# Altium footprint library Libraries_2014_0618.PcbLib: 391 footprints (part 11 of 25)
Each footprint in its own frame and in the unit in brackets; x right, y up, seen from the top. Pads: shape width x height; smd on the part's side, far side on the other; paste and mask are expansions set on the pad; w line width, h text height; cw(c..) or ccw(c..) is an arc to the next point about the centre after c.
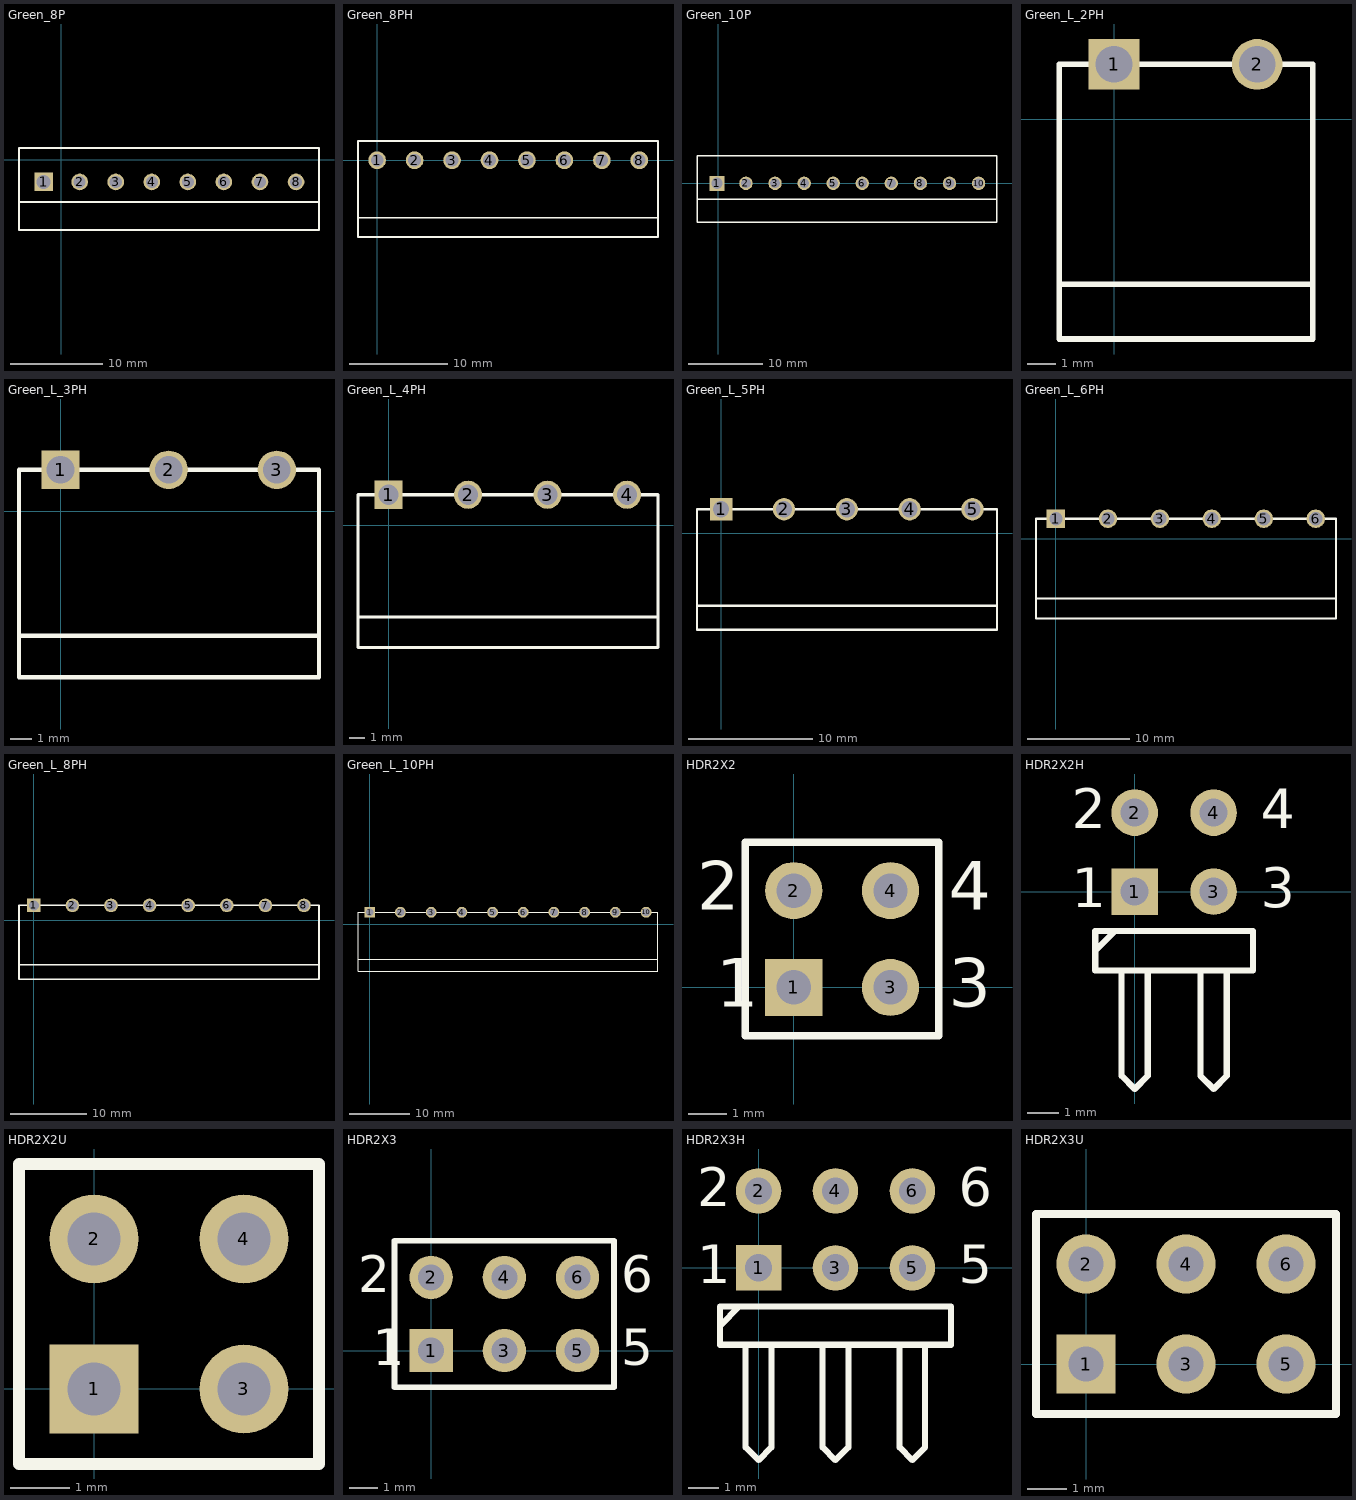
[diagram p10: the footprints below, top view; thin cyan lines are the x and y axes]

## Green_8P [mm]
pads (8):
  rect 2x2 hole 1.5: 1(-1.905,-2.413)
  round 1.8 hole 1.3: 2(1.995,-2.413) 3(5.895,-2.413) 4(9.795,-2.413) 5(13.695,-2.413) 6(17.595,-2.413) 7(21.495,-2.413) 8(25.395,-2.413)
Top Overlay:
  lines w0.2: -4.572,-4.572 8.382,-4.572 ; -0.762,-7.62 12.192,-7.62 ; -0.762,-4.572 12.192,-4.572 ; 8.382,-7.62 -4.572,-7.62 -4.572,1.27 12.192,1.27 ; 11.028,-7.62 23.982,-7.62 ; 11.028,-4.572 23.982,-4.572 ; 11.028,1.27 27.792,1.27 ; 23.957,-7.62 27.864,-7.62 ; 23.957,-4.572 27.864,-4.572 ; 27.882,-7.62 27.882,1.27

## Green_8PH [mm]
pads (8):
  round 1.8 hole 1.3: 1(0,0) 2(3.81,0) 3(7.62,0) 4(11.43,0) 5(15.24,0) 6(19.05,0) 7(22.86,0) 8(26.67,0)
Top Overlay:
  lines w0.2: 28.575,-5.85 -1.95,-5.85 ; -1.95,-5.85 -1.95,1.95 28.575,1.95 28.575,-7.8 13.65,-7.8 -1.95,-7.8 -1.95,-5.85

## Green_10P [mm]
pads (10):
  rect 2x2 hole 1.5: 1(-0.18,0)
  round 1.8 hole 1.3: 2(3.72,0) 3(7.62,0) 4(11.52,0) 5(15.42,0) 6(19.32,0) 7(23.22,0) 8(27.12,0) 9(31.025,-0.01) 10(34.925,-0.01)
Top Overlay:
  lines w0.2: -2.847,-2.159 10.107,-2.159 ; 0.963,-5.207 13.917,-5.207 ; 0.963,-2.159 13.917,-2.159 ; 10.107,-5.207 -2.847,-5.207 -2.847,3.683 13.917,3.683 ; 12.753,-5.207 25.707,-5.207 ; 12.753,-2.159 25.707,-2.159 ; 12.753,3.683 37.393,3.683 37.393,-5.207 25.682,-5.207 ; 25.682,-2.159 29.589,-2.159 ; 29.589,-2.169 37.393,-2.169

## Green_L_2PH [mm]
pads (2):
  rect 1.8x1.8 hole 1.3: 1(0,1.95)
  round 1.8 hole 1.3: 2(5.08,1.95)
Top Overlay:
  lines w0.2: 7.06,-5.85 -1.95,-5.85 ; -1.95,-5.85 -1.95,1.95 7.06,1.95 7.06,-7.8 -1.95,-7.8 -1.95,-5.85

## Green_L_3PH [mm]
pads (3):
  rect 1.8x1.8 hole 1.3: 1(0,1.95)
  round 1.8 hole 1.3: 2(5.08,1.95) 3(10.16,1.95)
Top Overlay:
  lines w0.2: 12.14,-5.85 -1.95,-5.85 ; -1.95,-5.85 -1.95,-7.8 12.14,-7.8 12.14,1.95 -1.95,1.95 -1.95,-5.85

## Green_L_4PH [mm]
pads (4):
  rect 1.8x1.8 hole 1.3: 1(0,1.95)
  round 1.8 hole 1.3: 2(5.08,1.95) 3(10.16,1.95) 4(15.24,1.95)
Top Overlay:
  lines w0.2: 17.22,-5.85 -1.95,-5.85 ; -1.95,-5.85 -1.95,1.95 17.22,1.95 17.22,-7.8 13.65,-7.8 -1.95,-7.8 -1.95,-5.85

## Green_L_5PH [mm]
pads (5):
  rect 1.8x1.8 hole 1.3: 1(0,1.95)
  round 1.8 hole 1.3: 2(5.08,1.95) 3(10.16,1.95) 4(15.24,1.95) 5(20.32,1.95)
Top Overlay:
  lines w0.2: 22.3,-5.85 -1.95,-5.85 ; -1.95,-5.85 -1.95,-7.8 13.65,-7.8 22.3,-7.8 22.3,1.95 -1.95,1.95 -1.95,-5.85

## Green_L_6PH [mm]
pads (6):
  rect 1.8x1.8 hole 1.3: 1(0,1.95)
  round 1.8 hole 1.3: 2(5.08,1.95) 3(10.16,1.95) 4(15.24,1.95) 5(20.32,1.95) 6(25.4,1.95)
Top Overlay:
  lines w0.2: 27.38,-5.85 -1.95,-5.85 ; -1.95,-5.85 -1.95,1.95 27.38,1.95 27.38,-7.8 13.65,-7.8 -1.95,-7.8 -1.95,-5.85

## Green_L_8PH [mm]
pads (8):
  rect 1.8x1.8 hole 1.3: 1(0,1.95)
  round 1.8 hole 1.3: 2(5.08,1.95) 3(10.16,1.95) 4(15.24,1.95) 5(20.32,1.95) 6(25.4,1.95) 7(30.48,1.95) 8(35.56,1.95)
Top Overlay:
  lines w0.2: 37.5,-7.8 13.65,-7.8 -1.95,-7.8 -1.95,-5.85 ; 37.5,-5.85 -1.95,-5.85 ; 37.5,1.95 -1.95,1.95 -1.95,-5.85 ; 37.54,-7.8 37.54,1.95

## Green_L_10PH [mm]
pads (10):
  rect 1.8x1.8 hole 1.3: 1(0,1.95)
  round 1.8 hole 1.3: 2(5.08,1.95) 3(10.16,1.95) 4(15.24,1.95) 5(20.32,1.95) 6(25.4,1.95) 7(30.48,1.95) 8(35.56,1.95) 9(40.64,1.95) 10(45.72,1.95)
Top Overlay:
  lines w0.2: 47.7,-5.85 -1.95,-5.85 ; -1.95,-5.85 -1.95,1.95 47.7,1.95 47.7,-7.8 13.65,-7.8 -1.95,-7.8 -1.95,-5.85

## HDR2X2 [mm] "Connector; Header; 2x2 Position"
pads (4):
  rect 1.5x1.5 hole 0.9: 1(0,0)
  round 1.5 hole 0.9: 2(0,2.54) 3(2.54,0) 4(2.54,2.54)
Top Overlay:
  lines w0.2: -1.27,-1.27 3.81,-1.27 3.81,3.81 -1.27,3.81 -1.27,-1.27
  text "3" at 4.064,-0.508 h1.27
  text "4" at 4.064,2.032 h1.27
  text "2" at -2.54,2.032 h1.27
  text "1" at -2.032,-0.508 h1.27

## HDR2X2H [mm] "Connector; Header; 2x2 Position; Right Angle"
pads (4):
  rect 1.5x1.5 hole 0.9: 1(0,0)
  round 1.5 hole 0.9: 2(0,2.54) 3(2.54,0) 4(2.54,2.54)
Top Overlay:
  lines w0.2: -1.27,-1.905 -0.635,-1.27 ; -0.423,-2.54 -0.423,-5.927 0,-6.35 0.423,-5.927 0.423,-2.54 ; 2.117,-2.54 2.117,-5.927 2.54,-6.35 2.963,-5.927 2.963,-2.54 ; -1.27,-2.54 3.81,-2.54 3.81,-1.27 -1.27,-1.27 -1.27,-2.54
  text "3" at 4.064,-0.508 h1.27
  text "4" at 4.064,2.032 h1.27
  text "2" at -2.032,2.032 h1.27
  text "1" at -2.032,-0.508 h1.27

## HDR2X2U [mm] "Connector; Header; 2x2 Position"
pads (4):
  rect 1.5x1.5 hole 0.9: 1(0,0)
  round 1.5 hole 0.9: 2(0,2.54) 3(2.54,0) 4(2.54,2.54)
Top Overlay:
  lines w0.2: -1.27,-1.27 -1.27,3.81 3.81,3.81 3.81,-1.27 -1.27,-1.27

## HDR2X3 [mm] "Connector; Header; 3x2 Position"
pads (6):
  rect 1.5x1.5 hole 0.9: 1(0,0)
  round 1.5 hole 0.9: 2(0,2.54) 3(2.54,0) 4(2.54,2.54) 5(5.08,0) 6(5.08,2.54)
Top Overlay:
  lines w0.2: 1.482,-1.27 6.35,-1.27 ; 6.35,-1.27 6.35,3.81 -1.27,3.81 -1.27,-1.27 6.35,-1.27
  text "6" at 6.604,2.032 h1.27
  text "5" at 6.604,-0.508 h1.27
  text "2" at -2.54,2.032 h1.27
  text "1" at -2.032,-0.508 h1.27

## HDR2X3H [mm] "Connector; Header; 3x2 Position; Right Angle"
pads (6):
  rect 1.5x1.5 hole 0.9: 1(0,0)
  round 1.5 hole 0.9: 2(0,2.54) 3(2.54,0) 4(2.54,2.54) 5(5.08,0) 6(5.08,2.54)
Top Overlay:
  lines w0.2: -1.27,-1.905 -0.635,-1.27 ; -0.423,-2.54 -0.423,-5.927 0,-6.35 0.423,-5.927 0.423,-2.54 ; 2.117,-2.54 2.117,-5.927 2.54,-6.35 2.963,-5.927 2.963,-2.54 ; 4.657,-2.54 4.657,-5.927 5.08,-6.35 5.503,-5.927 5.503,-2.54 ; -1.27,-2.54 6.35,-2.54 6.35,-1.27 -1.27,-1.27 -1.27,-2.54
  text "2" at -2.032,2.032 h1.27
  text "1" at -2.032,-0.508 h1.27
  text "5" at 6.604,-0.508 h1.27
  text "6" at 6.604,2.032 h1.27

## HDR2X3U [mm] "Connector; Header; 3x2 Position"
pads (6):
  rect 1.5x1.5 hole 0.9: 1(0,0)
  round 1.5 hole 0.9: 2(0,2.54) 3(2.54,0) 4(2.54,2.54) 5(5.08,0) 6(5.08,2.54)
Top Overlay:
  lines w0.2: 1.482,-1.27 6.35,-1.27 ; 6.35,-1.27 6.35,3.81 -1.27,3.81 -1.27,-1.27 6.35,-1.27